# Altium footprint library fszhang.PcbLib: 1032 footprints (part 35 of 66)
Each footprint in its own frame and in the unit in brackets; x right, y up, seen from the top. Pads: shape width x height; smd on the part's side, far side on the other; paste and mask are expansions set on the pad; w line width, h text height; cw(c..) or ccw(c..) is an arc to the next point about the centre after c.
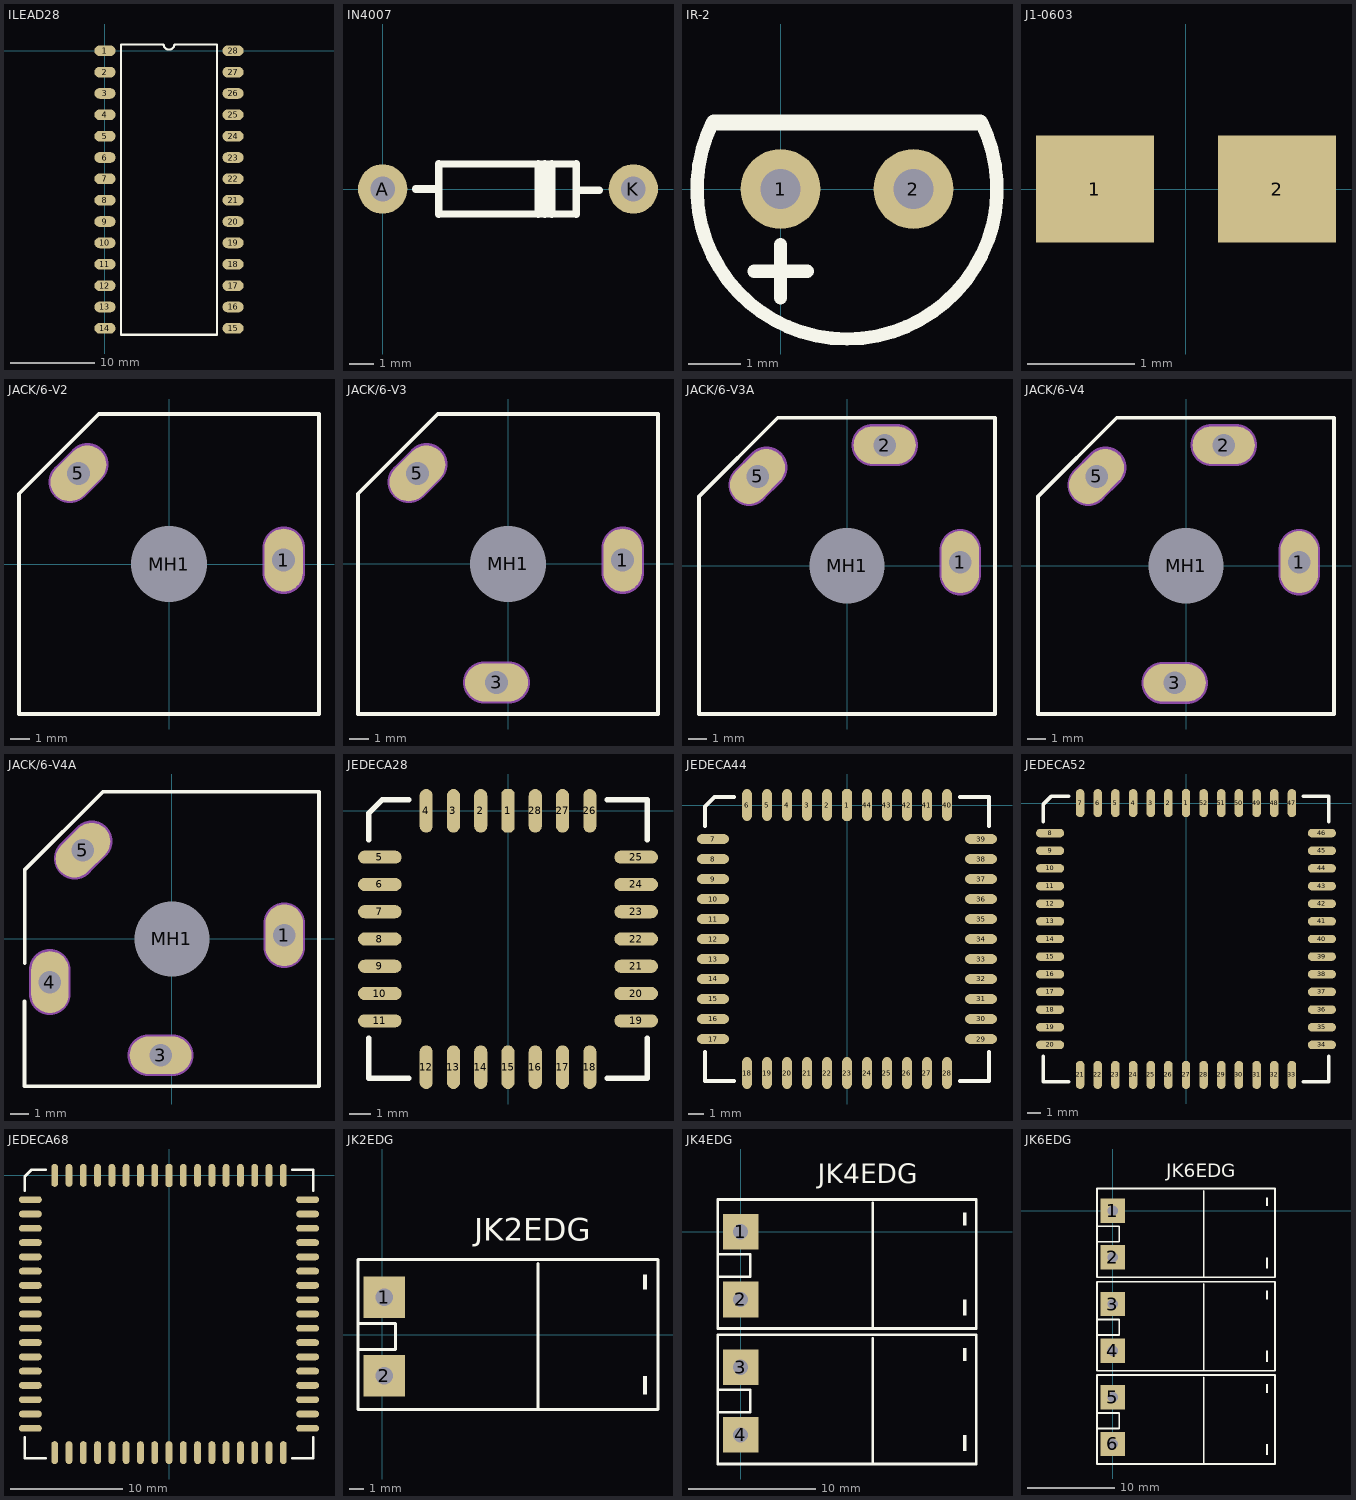
[diagram p34: the footprints below, top view; thin cyan lines are the x and y axes]

## ILEAD28 [mil]
pads (28):
  oval 100x50 smd: 1(0,0) 2(0,-100) 3(0,-200) 4(0,-300) 5(0,-400) 6(0,-500) 7(0,-600) 8(0,-700) 9(0,-800) 10(0,-900) 11(0,-1000) 12(0,-1100) 13(0,-1200) 14(0,-1300) 15(600,-1300) 16(600,-1200) 17(600,-1100) 18(600,-1000) 19(600,-900) 20(600,-800) 21(600,-700) 22(600,-600) 23(600,-500) 24(600,-400) 25(600,-300) 26(600,-200) 27(600,-100) 28(600,0)
Top Overlay:
  lines w10: 75,-1330 75,30 275,30 ccw(c300,30) 325,30 525,30 525,-1330 75,-1330

## IN4007 [mm]
pads (2):
  round 2 hole 1: A(0,0) K(10.16,0)
Top Overlay:
  lines w0.305: 1.35,0 2.282,0 ; 2.282,-1.016 2.282,1.016 ; 2.289,-1.007 7.841,-1.014 ; 2.289,1.007 7.841,1.014 ; 6.3,-1.016 6.3,1.016 ; 6.575,-1.016 6.575,1.016 ; 6.85,-1.016 6.85,1.016 ; 7.853,-1.016 7.853,1.016 ; 7.853,-0.05 8.785,-0.05

## IR-2 [mil]
pads (2):
  round 60 hole 30: 1(0,0) 2(100,0)
Top Overlay:
  lines w10: -50.96,50.48 ccw(c50,0) 150.96,50.48 ; -20,-62 20,-62 ; 0,-82 0,-42
  lines w12: -50,50 150,50

## J1-0603 [mm] "Chip Resistor; Body 1.6 x 0.8 mm (LxW typ)"
height 0.6
pads (2):
  rect 1.1x1 smd: 1(-0.85,0) 2(0.85,0)

## JACK/6-V2 [mm] "Connector; Jack Socket, 1/4\" [6.5mm], Thru-Hole, 2 Position, Vertical, Body 15.7 x 15.7 x 31 mm (WxTxH)"
height 31.1
pads (3):
  oval 2x3.3 hole 1.2: 1(6,0.2)
  oval 2x3.3 hole 1.2 rot 135: 5(-4.738,4.738)
  round 3.7 hole 4: MH1(0,0)
Top Overlay:
  lines w0.2: -7.85,-7.85 -7.85,3.675 -3.675,7.85 7.85,7.85 7.85,-7.85 -7.85,-7.85
Mechanical 1:
  lines w1.2: -5.185,4.295 -4.266,5.214 ; 6,-0.45 6,0.85
  text "Mech 2 - Clearance, move to internal plane if present" at -7.9,8.16 h0.3
  text "Mech 1 - Slot cut-out" at -7.9,8.66 h0.3
  text "Assign keep-out area to slot" at -7.9,10.16 h0.3
  text "Slot 1.2x2.5mm, PTH" at -7.9,9.16 h0.3
  text "Alert PCB fab to slot details" at -7.9,9.66 h0.3
Mechanical 2:
  lines w2.216: -5.185,4.295 -4.266,5.214 ; 6,-0.45 6,0.85

## JACK/6-V3 [mm] "Connector; Jack Socket, 1/4\" [6.5mm], Thru-Hole, 3 Position, Vertical, Body 15.7 x 15.7 x 31 mm (WxTxH)"
height 31.1
pads (4):
  oval 2x3.3 hole 1.2: 1(6,0.2)
  oval 3.3x2 hole 1.2: 3(-0.6,-6.2)
  oval 2x3.3 hole 1.2 rot 135: 5(-4.738,4.738)
  round 3.7 hole 4: MH1(0,0)
Top Overlay:
  lines w0.2: -7.85,-7.85 7.85,-7.85 7.85,7.85 -3.675,7.85 -7.85,3.675 -7.85,-7.85
Mechanical 1:
  lines w1.2: -5.185,4.295 -4.266,5.214 ; -1.25,-6.2 0.05,-6.2 ; 6,-0.45 6,0.85
  text "Alert PCB fab to slot details" at -7.9,9.66 h0.3
  text "Slot 1.2x2.5mm, PTH" at -7.9,9.16 h0.3
  text "Assign keep-out area to slot" at -7.9,10.16 h0.3
  text "Mech 1 - Slot cut-out" at -7.9,8.66 h0.3
  text "Mech 2 - Clearance, move to internal plane if present" at -7.9,8.16 h0.3
Mechanical 2:
  lines w2.216: -5.185,4.295 -4.266,5.214 ; -1.25,-6.2 0.05,-6.2 ; 6,-0.45 6,0.85

## JACK/6-V3A [mm] "Connector; Jack Socket, 1/4\" [6.5mm], Thru-Hole, 3 Position, Vertical, Body 15.7 x 15.7 x 31 mm (WxTxH)"
height 31.1
pads (4):
  oval 2x3.3 hole 1.2: 1(6,0.2)
  oval 3.3x2 hole 1.2: 2(2,6.4)
  oval 2x3.3 hole 1.2 rot 135: 5(-4.738,4.738)
  round 3.7 hole 4: MH1(0,0)
Top Overlay:
  lines w0.2: -7.85,-7.85 -7.85,3.675 -3.675,7.85 7.85,7.85 7.85,-7.85 -7.85,-7.85
Mechanical 1:
  lines w1.2: -5.185,4.295 -4.266,5.214 ; 1.35,6.4 2.65,6.4 ; 6,-0.45 6,0.85
  text "Alert PCB fab to slot details" at -7.9,9.66 h0.3
  text "Slot 1.2x2.5mm, PTH" at -7.9,9.16 h0.3
  text "Assign keep-out area to slot" at -7.9,10.16 h0.3
  text "Mech 1 - Slot cut-out" at -7.9,8.66 h0.3
  text "Mech 2 - Clearance, move to internal plane if present" at -7.9,8.16 h0.3
Mechanical 2:
  lines w2.216: -5.185,4.295 -4.266,5.214 ; 1.35,6.4 2.65,6.4 ; 6,-0.45 6,0.85

## JACK/6-V4 [mm] "Connector; Jack Socket, 1/4\" [6.5mm], Thru-Hole, 4 Position, Vertical, Body 15.7 x 15.7 x 31 mm (WxTxH)"
height 31.1
pads (5):
  oval 2x3.3 hole 1.2: 1(6,0.2)
  oval 3.3x2 hole 1.2: 2(2,6.4) 3(-0.6,-6.2)
  oval 2x3.3 hole 1.2 rot 135: 5(-4.738,4.738)
  round 3.7 hole 4: MH1(0,0)
Top Overlay:
  lines w0.2: -7.85,-7.85 -7.85,3.675 -3.675,7.85 7.85,7.85 7.85,-7.85 -7.85,-7.85
Mechanical 1:
  lines w1.2: -5.185,4.295 -4.266,5.214 ; -1.25,-6.2 0.05,-6.2 ; 1.35,6.4 2.65,6.4 ; 6,-0.45 6,0.85
  text "Alert PCB fab to slot details" at -7.9,9.66 h0.3
  text "Slot 1.2x2.5mm, PTH" at -7.9,9.16 h0.3
  text "Assign keep-out area to slot" at -7.9,10.16 h0.3
  text "Mech 1 - Slot cut-out" at -7.9,8.66 h0.3
  text "Mech 2 - Clearance, move to internal plane if present" at -7.9,8.16 h0.3
Mechanical 2:
  lines w2.216: -5.185,4.295 -4.266,5.214 ; -1.25,-6.2 0.05,-6.2 ; 1.35,6.4 2.65,6.4 ; 6,-0.45 6,0.85

## JACK/6-V4A [mm] "Connector; Jack Socket, 1/4\" [6.5mm], Thru-Hole, 4 Position, Vertical, Body 15.7 x 15.7 x 31 mm (WxTxH)"
height 31.1
pads (5):
  oval 2x3.3 hole 1.2: 1(6,0.2) 4(-6.5,-2.3)
  oval 3.3x2 hole 1.2: 3(-0.6,-6.2)
  oval 2x3.3 hole 1.2 rot 135: 5(-4.738,4.738)
  round 3.7 hole 4: MH1(0,0)
Top Overlay:
  lines w0.2: -7.85,-3.32 -7.85,-7.85 7.85,-7.85 7.85,7.85 -3.675,7.85 -7.85,3.675 -7.85,-1.28
Mechanical 1:
  lines w1.2: -6.5,-2.95 -6.5,-1.65 ; -5.185,4.295 -4.266,5.214 ; -1.25,-6.2 0.05,-6.2 ; 6,-0.45 6,0.85
  text "Alert PCB fab to slot details" at -7.9,9.66 h0.3
  text "Slot 1.2x2.5mm, PTH" at -7.9,9.16 h0.3
  text "Assign keep-out area to slot" at -7.9,10.16 h0.3
  text "Mech 1 - Slot cut-out" at -7.9,8.66 h0.3
  text "Mech 2 - Clearance, move to internal plane if present" at -7.9,8.16 h0.3
Mechanical 2:
  lines w2.216: -6.5,-2.95 -6.5,-1.65 ; -5.185,4.295 -4.266,5.214 ; -1.25,-6.2 0.05,-6.2 ; 6,-0.45 6,0.85

## JEDECA28 [mil]
pads (28):
  oct 24x80 smd: 1(0,0)
  oval 24x80 smd: 2(-50,0) 3(-100,0) 4(-150,0) 12(-150,-470) 13(-100,-470) 14(-50,-470) 15(0,-470) 16(50,-470) 17(100,-470) 18(150,-470) 26(150,0) 27(100,0) 28(50,0)
  oval 80x24 smd: 5(-235,-85) 6(-235,-135) 7(-235,-185) 8(-235,-235) 9(-235,-285) 10(-235,-335) 11(-235,-385) 19(235,-385) 20(235,-335) 21(235,-285) 22(235,-235) 23(235,-185) 24(235,-135) 25(235,-85)
Top Overlay:
  lines w10: -255,-417 -255,-490 -182,-490 ; -255,-53 -255,-4 -231,20 -182,20 ; 182,-490 255,-490 255,-417 ; 182,20 255,20 255,-53

## JEDECA44 [mil]
pads (44):
  oct 24x80 smd: 1(0,0)
  oval 24x80 smd: 2(-50,0) 3(-100,0) 4(-150,0) 5(-200,0) 6(-250,0) 18(-250,-670) 19(-200,-670) 20(-150,-670) 21(-100,-670) 22(-50,-670) 23(0,-670) 24(50,-670) 25(100,-670) 26(150,-670) 27(200,-670) 28(250,-670) 40(250,0) 41(200,0) 42(150,0) 43(100,0) 44(50,0)
  oval 80x24 smd: 7(-335,-85) 8(-335,-135) 9(-335,-185) 10(-335,-235) 11(-335,-285) 12(-335,-335) 13(-335,-385) 14(-335,-435) 15(-335,-485) 16(-335,-535) 17(-335,-585) 29(335,-585) 30(335,-535) 31(335,-485) 32(335,-435) 33(335,-385) 34(335,-335) 35(335,-285) 36(335,-235) 37(335,-185) 38(335,-135) 39(335,-85)
Top Overlay:
  lines w10: -355,-617 -355,-690 -282,-690 ; -355,-53 -355,-4 -331,20 -282,20 ; 282,-690 355,-690 355,-617 ; 282,20 355,20 355,-53

## JEDECA52 [mil]
pads (52):
  oct 24x80 smd: 1(0,0)
  oval 24x80 smd: 2(-50,0) 3(-100,0) 4(-150,0) 5(-200,0) 6(-250,0) 7(-300,0) 21(-300,-770) 22(-250,-770) 23(-200,-770) 24(-150,-770) 25(-100,-770) 26(-50,-770) 27(0,-770) 28(50,-770) 29(100,-770) 30(150,-770) 31(200,-770) 32(250,-770) 33(300,-770) 47(300,0) 48(250,0) 49(200,0) 50(150,0) 51(100,0) 52(50,0)
  oval 80x24 smd: 8(-385,-85) 9(-385,-135) 10(-385,-185) 11(-385,-235) 12(-385,-285) 13(-385,-335) 14(-385,-385) 15(-385,-435) 16(-385,-485) 17(-385,-535) 18(-385,-585) 19(-385,-635) 20(-385,-685) 34(385,-685) 35(385,-635) 36(385,-585) 37(385,-535) 38(385,-485) 39(385,-435) 40(385,-385) 41(385,-335) 42(385,-285) 43(385,-235) 44(385,-185) 45(385,-135) 46(385,-85)
Top Overlay:
  lines w10: -405,-717 -405,-790 -332,-790 ; -405,-53 -405,-4 -381,20 -332,20 ; 332,-790 405,-790 405,-717 ; 332,20 405,20 405,-53

## JEDECA68 [mil]
pads (68):
  oct 24x80 smd: 1(0,0)
  oval 24x80 smd: 2(-50,0) 3(-100,0) 4(-150,0) 5(-200,0) 6(-250,0) 7(-300,0) 8(-350,0) 9(-400,0) 27(-400,-970) 28(-350,-970) 29(-300,-970) 30(-250,-970) 31(-200,-970) 32(-150,-970) 33(-100,-970) 34(-50,-970) 35(0,-970) 36(50,-970) 37(100,-970) 38(150,-970) 39(200,-970) 40(250,-970) 41(300,-970) 42(350,-970) 43(400,-970) 61(400,0) 62(350,0) 63(300,0) 64(250,0) 65(200,0) 66(150,0) 67(100,0) 68(50,0)
  oval 80x24 smd: 10(-485,-85) 11(-485,-135) 12(-485,-185) 13(-485,-235) 14(-485,-285) 15(-485,-335) 16(-485,-385) 17(-485,-435) 18(-485,-485) 19(-485,-535) 20(-485,-585) 21(-485,-635) 22(-485,-685) 23(-485,-735) 24(-485,-785) 25(-485,-835) 26(-485,-885) 44(485,-885) 45(485,-835) 46(485,-785) 47(485,-735) 48(485,-685) 49(485,-635) 50(485,-585) 51(485,-535) 52(485,-485) 53(485,-435) 54(485,-385) 55(485,-335) 56(485,-285) 57(485,-235) 58(485,-185) 59(485,-135) 60(485,-85)
Top Overlay:
  lines w10: -505,-917 -505,-990 -432,-990 ; -505,-53 -505,-4 -481,20 -432,20 ; 432,-990 505,-990 505,-917 ; 432,20 505,20 505,-53

## JK2EDG [mm] "9.5mm"
pads (2):
  rect 2.8x2.8 hole 1.2: 1(0.127,2.54) 2(0.127,-2.794)
Top Overlay:
  region: 17.907,-2.794 17.653,-2.794 17.653,-4.064 17.907,-4.064
  region: 17.907,4.064 17.653,4.064 17.653,3.048 17.907,3.048
  lines w0.2: -1.651,-1.016 0.889,-1.016 0.889,0.762 -1.651,0.762 ; 10.541,-5.08 10.541,4.826 ; -1.651,-5.08 18.669,-5.08 18.669,5.08 -1.651,5.08 -1.651,-5.08
  text "JK2EDG" at 6.223,6.35 h1.52

## JK4EDG [mm] "9.5mm"
pads (4):
  rect 2.8x2.8 hole 1.2: 1(0,0) 2(0,-5.334) 3(0,-10.668) 4(0,-16.002)
Top Overlay:
  region: 17.78,-16.002 17.526,-16.002 17.526,-17.272 17.78,-17.272
  region: 17.78,-9.144 17.526,-9.144 17.526,-10.16 17.78,-10.16
  region: 17.78,-5.334 17.526,-5.334 17.526,-6.604 17.78,-6.604
  region: 17.78,1.524 17.526,1.524 17.526,0.508 17.78,0.508
  lines w0.2: -1.778,-14.224 0.762,-14.224 0.762,-12.446 -1.778,-12.446 ; -1.778,-3.556 0.762,-3.556 0.762,-1.778 -1.778,-1.778 ; 10.414,-18.288 10.414,-8.382 ; 10.414,-7.62 10.414,2.286 ; -1.778,-18.288 18.542,-18.288 18.542,-8.128 -1.778,-8.128 -1.778,-18.288 ; -1.778,-7.62 18.542,-7.62 18.542,2.54 -1.778,2.54 -1.778,-7.62
  text "JK4EDG" at 6.096,3.81 h1.52

## JK6EDG [mm] "9.5mm"
pads (6):
  rect 2.8x2.8 hole 1.2: 1(0,0) 2(0,-5.334) 3(0,-10.668) 4(0,-16.002) 5(0,-21.336) 6(0,-26.67)
Top Overlay:
  region: 17.78,-16.002 17.526,-16.002 17.526,-17.272 17.78,-17.272
  region: 17.78,-9.144 17.526,-9.144 17.526,-10.16 17.78,-10.16
  region: 17.78,-5.334 17.526,-5.334 17.526,-6.604 17.78,-6.604
  region: 17.78,1.524 17.526,1.524 17.526,0.508 17.78,0.508
  region: 17.78,-19.812 17.526,-19.812 17.526,-20.828 17.78,-20.828
  region: 17.78,-26.67 17.526,-26.67 17.526,-27.94 17.78,-27.94
  lines w0.2: -1.778,-24.892 0.762,-24.892 0.762,-23.114 -1.778,-23.114 ; -1.778,-14.224 0.762,-14.224 0.762,-12.446 -1.778,-12.446 ; -1.778,-3.556 0.762,-3.556 0.762,-1.778 -1.778,-1.778 ; 10.414,-28.956 10.414,-19.05 ; 10.414,-18.288 10.414,-8.382 ; 10.414,-7.62 10.414,2.286 ; -1.778,-28.956 -1.778,-18.796 18.542,-18.796 18.542,-28.956 -1.778,-28.956 ; -1.778,-18.288 18.542,-18.288 18.542,-8.128 -1.778,-8.128 -1.778,-18.288 ; -1.778,-7.62 18.542,-7.62 18.542,2.54 -1.778,2.54 -1.778,-7.62
  text "JK6EDG" at 6.096,3.81 h1.52